# Altium footprint library Tomra_Cadstar_Footprints.PcbLib: 380 footprints (part 17 of 24)
Each footprint in its own frame and in the unit in brackets; x right, y up, seen from the top. Pads: shape width x height; smd on the part's side, far side on the other; paste and mask are expansions set on the pad; w line width, h text height; cw(c..) or ccw(c..) is an arc to the next point about the centre after c.
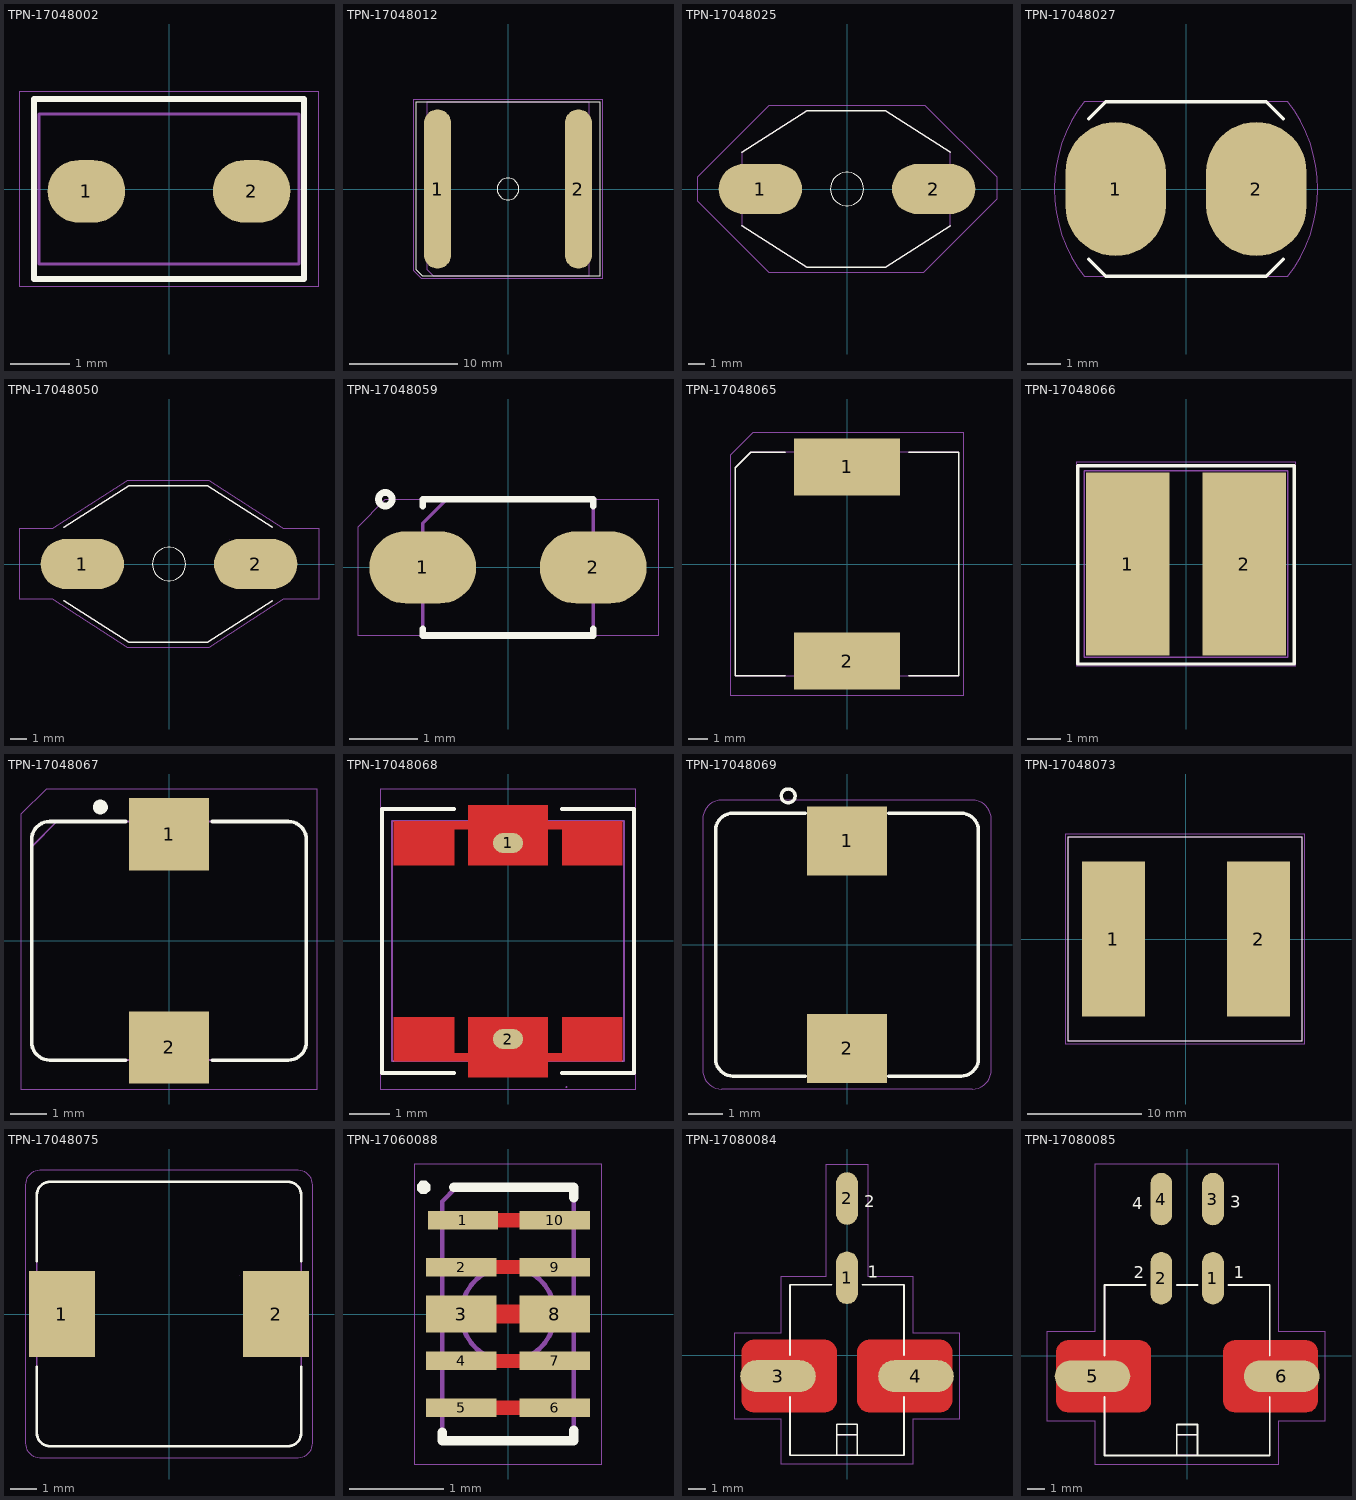
[diagram p16: the footprints below, top view; thin cyan lines are the x and y axes]

## TPN-17048002 [mm]
pads (2):
  oval 1.314x1.06 smd paste+0 mask+0: 1(-1.4,-0.04) 2(1.4,-0.04)
Top Silk:
  lines w0.1: -2.286,-1.524 2.286,-1.524 2.286,1.524 -2.286,1.524 -2.286,-1.524
  text ".Designator" at -3.599,-0.35 h0.7
Top Assembly:
  lines w0.05: -2.2,-1.27 2.2,-1.27 2.2,1.27 -2.2,1.27 -2.2,-1.27
Top Placement:
  lines w0.01: -2.54,-1.651 2.54,-1.651 2.54,1.651 -2.54,1.651 -2.54,-1.651

## TPN-17048012 [mm]
pads (2):
  oval 2.5x14.692 smd paste+0 mask+0: 1(-6.5,0) 2(6.5,0)
Top Silk:
  lines w0.1: -8.5,-7.4 -7.9,-8 8.5,-8 8.5,8 -8.5,8 -8.5,-7.4 ; 0,-1 cw(c0,0) 0,1 cw(c0,0) 0,-1
  text ".Designator" at -3.599,-0.35 h0.7
Top Assembly:
  lines w0.05: -7.5,-7.4 -6.9,-8 7.5,-8 7.5,8 -7.5,8 -7.5,-7.4
Top Placement:
  lines w0.01: -8.75,-7.5 -8,-8.25 8.75,-8.25 8.75,8.25 -8.75,8.25 -8.75,-7.5

## TPN-17048025 [mm]
height 11.3
pads (2):
  oval 5x3 smd paste+0 mask+0: 1(-5.2,0) 2(5.2,0)
Top Silk:
  lines w0.05: -1,0 ccw(c0,0) 1,0 ccw(c0,0) -1,0
  lines w0.1: -6.3,-2.2 -2.4,-4.7 2.3,-4.7 6.2,-2.2 ; -6.3,2.2 -2.4,4.7 2.3,4.7 6.2,2.2
Top Assembly:
  lines w0.05: -6.3,-2.2 -2.4,-4.7 2.3,-4.7 6.2,-2.2 6.2,2.2 2.3,4.7 -2.4,4.7 -6.3,2.2 -6.3,-2.2
Top Placement:
  lines w0.01: -9,-0.7 -4.7,-5 4.6,-5 9,-0.6 9,0.7 4.7,5 -4.7,5 -9,0.7 -9,-0.7
  lines w0.05: 3.653,1.462 3.655,1.463 3.655,1.464 3.654,1.464 3.654,1.463 3.653,1.462

## TPN-17048027 [mm]
height 4.85
pads (2):
  oval 3x4 smd paste+0 mask+0: 1(-2.1,0) 2(2.1,0)
Top Silk:
  lines w0.1: -2.9,-2.1 -2.4,-2.6 2.4,-2.6 2.9,-2.1 ; -2.9,2.1 -2.4,2.6 2.4,2.6 2.9,2.1
  text ".Designator" at -3.599,-0.35 h0.7
Top Assembly:
  lines w0.05: -2.9,-2.1 -2.4,-2.6 2.4,-2.6 2.9,-2.1 ; -2.9,2.1 -2.4,2.6 2.4,2.6 2.9,2.1
Top Placement:
  lines w0.01: -3.035,-2.6 3.035,-2.6 ccw(c-0.271,0) 3.035,2.6 -3.035,2.6 ccw(c0.271,0) -3.035,-2.6

## TPN-17048050 [mm]
height 11.3
pads (2):
  oval 5x3 smd paste+0 mask+0: 1(-5.2,0) 2(5.2,0)
Top Silk:
  lines w0.05: -1,0 ccw(c0,0) 1,0 ccw(c0,0) -1,0
  lines w0.1: -2.4,-4.7 -6.3,-2.2 -2.4,-4.7 ; -2.4,-4.7 2.3,-4.7 ; -2.4,-4.7 2.3,-4.7 ; -2.4,4.7 2.3,4.7 ; -2.4,4.7 -6.3,2.2 -2.4,4.7 ; -2.4,4.7 2.3,4.7 ; 2.3,-4.7 6.2,-2.2 2.3,-4.7 ; 2.3,4.7 6.2,2.2 2.3,4.7
  text ".Designator" at -2.6,2.471 h0.7
Top Assembly:
  lines w0.05: -6.3,-2.2 -2.4,-4.7 2.3,-4.7 6.2,-2.2 ; -6.3,2.2 -2.4,4.7 2.3,4.7 6.2,2.2
Top Placement:
  lines w0.01: -9,-2.1 -9,2.1 -7,2.1 -2.5,5 2.4,5 6.9,2.1 9,2.1 9,-2.1 6.9,-2.1 2.4,-5 -2.5,-5 -7,-2.1 -9,-2.1
  lines w0.05: 3.653,1.462 3.655,1.463 3.655,1.464 3.654,1.464 3.654,1.463 3.653,1.462

## TPN-17048059 [mm]
height 1.8
pads (2):
  oval 1.568x1.06 smd paste+0 mask+0: 1(-1.25,0) 2(1.25,0)
Top Silk:
  lines w0.1: -1.25,-0.9 -1.25,-1 1.25,-1 1.25,-0.9 ; -1.25,0.9 -1.25,1 1.25,1 1.25,0.9 ; -1.8,0.9 cw(c-1.8,1) -1.8,1.1 cw(c-1.8,1) -1.8,0.9
  text ".Designator" at -3.599,-0.35 h0.7
Top Assembly:
  lines w0.05: -1.25,-1 1.25,-1 1.25,1 -0.9,1 -1.25,0.65 -1.25,-1
Top Placement:
  lines w0.01: -2.2,-1 2.2,-1 2.2,1 -1.8,1 -2.2,0.6 -2.2,-1

## TPN-17048065 [mm]
height 10
pads (2):
  rrect0% 5.4x2.9 smd paste+0 mask+0: 1(0,4.95) 2(0,-4.95)
Top Silk:
  lines w0.1: -3.15,-5.7 -5.7,-5.7 -5.7,4.9 -4.9,5.7 -3.15,5.7 ; 3.15,-5.7 5.7,-5.7 5.7,5.7 3.15,5.7
  text ".Designator" at -3.599,-0.35 h0.7
Top Assembly:
  lines w0.05: -5.7,-5.7 5.7,-5.7 5.7,5.7 -4.9,5.7 -5.7,4.9 -5.7,-5.7
Top Placement:
  lines w0.01: -5.95,-6.7 5.95,-6.7 5.95,6.7 -4.8,6.7 -5.95,5.55 -5.95,-6.7
  lines w0.05: 1.462,-3.653 1.463,-3.655 1.464,-3.655 1.464,-3.654 1.463,-3.654 1.462,-3.653

## TPN-17048066 [mm]
height 2
pads (2):
  rrect0% 2.5x5.5 smd paste+0 mask+0: 1(-1.75,0) 2(1.75,0)
Top Silk:
  lines w0.1: -3.25,-3 3.25,-3 3.25,2.95 -3.25,2.95 -3.25,-3
  text ".Designator" at -3.599,-0.35 h0.7
Top Assembly:
  lines w0.05: -3.05,-2.8 3.05,-2.8 3.05,2.8 -3.05,2.8 -3.05,-2.8
Top Placement:
  lines w0.01: -3.3,-3.05 3.3,-3.05 3.3,3.05 -3.3,3.05 -3.3,-3.05

## TPN-17048067 [mm]
height 5.8
pads (2):
  rrect0% 2.2x2 smd paste+0 mask+0: 1(0,2.95) 2(0,-2.95)
Top Silk:
  region: -1.9,3.5 -1.94,3.5 -2.013,3.53 -2.07,3.587 -2.1,3.66 -2.1,3.74 -2.07,3.813 -2.013,3.87 -1.94,3.9 -1.9,3.9 -1.86,3.9 -1.787,3.87 -1.73,3.813 -1.7,3.74 -1.7,3.66 -1.73,3.587 -1.787,3.53 -1.86,3.5
  lines w0.1: -1.2,-3.3 -3.3,-3.3 cw(c-3.3,-2.8) -3.8,-2.8 -3.8,2.8 cw(c-3.3,2.8) -3.3,3.3 -1.2,3.3 ; 1.2,-3.3 3.3,-3.3 ccw(c3.3,-2.8) 3.8,-2.8 3.8,2.8 ccw(c3.3,2.8) 3.3,3.3 1.2,3.3
Top Assembly:
  lines w0.05: -3.8,-2.8 ccw(c-3.3,-2.8) -3.3,-3.3 3.3,-3.3 ccw(c3.3,-2.8) 3.8,-2.8 3.8,2.8 ccw(c3.3,2.8) 3.3,3.3 -3.1,3.3 -3.8,2.6 -3.8,-2.8
Top Placement:
  lines w0.01: -4.1,-4.1 4.1,-4.1 4.1,4.2 -3.4,4.2 -4.1,3.5 -4.1,-4.1

## TPN-17048068 [mm]
height 4.5
pads (2):
  oval 0.754x0.5 smd paste+0 mask+0: 1(0,2.45) 2(0,-2.45)
Top Elec:
  region: -2.85,1.9 -1.35,1.9 -1.35,2.8 -1,2.8 -1,1.9 1,1.9 1,2.8 1.35,2.8 1.35,1.9 2.85,1.9 2.85,3 1,3 1,3.4 -1,3.4 -1,3 -2.85,3
  region: 2.85,-1.9 1.35,-1.9 1.35,-2.8 1,-2.8 1,-1.9 -1,-1.9 -1,-2.8 -1.35,-2.8 -1.35,-1.9 -2.85,-1.9 -2.85,-3 -1,-3 -1,-3.4 1,-3.4 1,-3 2.85,-3
  region: -2.85,1.9 -1.35,1.9 -1.35,2.8 -1,2.8 -1,1.9 1,1.9 1,2.8 1.35,2.8 1.35,1.9 2.85,1.9 2.85,3 1,3 1,3.4 -1,3.4 -1,3 -2.85,3
Top Silk:
  lines w0.1: -1.35,-3.3 -3.15,-3.3 -3.15,3.3 -1.35,3.3 ; 1.35,-3.3 3.15,-3.3 3.15,3.3 1.35,3.3
Top Paste:
  region: -1,1.9 1,1.9 1,3.4 -1,3.4
  region: -1,-3.4 1,-3.4 1,-1.9 -1,-1.9
  region: -2.85,1.9 -1.5,1.9 -1.5,3 -2.85,3
  region: 1.5,-3 2.85,-3 2.85,-1.9 1.5,-1.9
  region: 1.5,1.9 2.85,1.9 2.85,3 1.5,3
  region: -2.85,-3 -1.5,-3 -1.5,-1.9 -2.85,-1.9
Top Solder Resist:
  region: 2.85,-1.9 -2.85,-1.9 -2.85,-3 -1,-3 -1,-3.4 1,-3.4 1,-3 2.85,-3
  region: -2.85,1.9 2.85,1.9 2.85,3 1,3 1,3.4 -1,3.4 -1,3 -2.85,3
Top Assembly:
  lines w0.05: -2.9,-3 2.9,-3 2.9,3 -2.9,3 -2.9,-3
  text ".Designator" at -1.799,-0.175 h0.35
Top Placement:
  lines w0.01: -3.2,-3.7 3.2,-3.7 3.2,3.8 -3.2,3.8 -3.2,-3.7
  lines w0.05: 1.462,-3.653 1.463,-3.655 1.464,-3.655 1.464,-3.654 1.463,-3.654 1.462,-3.653

## TPN-17048069 [mm]
height 5.5
pads (2):
  rrect0% 2.3x2 smd paste+0 mask+0: 1(0,3) 2(0,-3)
Top Silk:
  lines w0.1: -1.2,-3.8 -3.3,-3.8 cw(c-3.3,-3.3) -3.8,-3.3 -3.8,3.3 cw(c-3.3,3.3) -3.3,3.8 -1.2,3.8 ; 1.2,-3.8 3.3,-3.8 ccw(c3.3,-3.3) 3.8,-3.3 3.8,3.3 ccw(c3.3,3.3) 3.3,3.8 1.2,3.8 ; -1.7,4.1 cw(c-1.7,4.3) -1.7,4.5 cw(c-1.7,4.3) -1.7,4.1
  text ".Designator" at -3.599,-0.35 h0.7
Top Assembly:
  lines w0.05: -3.8,-3.3 ccw(c-3.3,-3.3) -3.3,-3.8 3.3,-3.8 ccw(c3.3,-3.3) 3.8,-3.3 3.8,3.3 ccw(c3.3,3.3) 3.3,3.8 -3.3,3.8 ccw(c-3.3,3.3) -3.8,3.3 -3.8,-3.3
Top Placement:
  lines w0.01: -4.175,-3.626 ccw(c-3.626,-3.626) -3.626,-4.175 3.626,-4.175 ccw(c3.626,-3.626) 4.175,-3.626 4.175,3.626 ccw(c3.626,3.626) 3.626,4.175 -3.626,4.175 ccw(c-3.626,3.626) -4.175,3.626 -4.175,-3.626

## TPN-17048073 [mm]
height 10
pads (2):
  rect 5.5x13.5 smd paste+0 mask+0: 1(-6.326,0) 2(6.374,0)
Top Silk:
  lines w0.1: -10.287,-8.89 10.16,-8.89 10.16,8.89 -10.287,8.89 -10.287,-8.89
Top Assembly:
  lines w0.05: -10.287,-8.89 10.16,-8.89 10.16,8.89 -10.287,8.89 -10.287,-8.89
Top Placement:
  lines w0.01: -10.537,-9.14 10.41,-9.14 10.41,9.14 -10.537,9.14 -10.537,-9.14
  text ".Designator" at -3.575,-0.35 h0.7

## TPN-17048075 [mm]
height 4.5
pads (2):
  rrect0% 2.5x3.25 smd paste+0 mask+0: 1(-4.05,0) 2(4.05,0)
Top Silk:
  lines w0.1: -5,-2 -5,-4.5 ccw(c-4.5,-4.5) -4.5,-5 4.5,-5 ccw(c4.5,-4.5) 5,-4.5 5,-2 ; -5,2 -5,4.5 cw(c-4.5,4.5) -4.5,5 4.5,5 cw(c4.5,4.5) 5,4.5 5,2
  text ".Designator" at 0.35,-3.599 h0.7
Top Assembly:
  lines w0.05: -5,-4.5 -5,4.5 cw(c-4.5,4.5) -4.5,5 4.5,5 cw(c4.5,4.5) 5,4.5 5,-4.5 cw(c4.5,-4.5) 4.5,-5 -4.5,-5 cw(c-4.5,-4.5) -5,-4.5
Top Placement:
  lines w0.01: -5.432,-4.889 -5.432,4.889 cw(c-4.889,4.889) -4.889,5.432 4.889,5.432 cw(c4.889,4.889) 5.432,4.889 5.432,-4.889 cw(c4.889,-4.889) 4.889,-5.432 -4.889,-5.432 cw(c-4.889,-4.889) -5.432,-4.889
  lines w0.05: 2.653,1.462 2.655,1.463 2.655,1.464 2.654,1.464 2.654,1.463 2.653,1.462

## TPN-17060088 [mm]
height 0.65
pads (10):
  rrect0% 0.75x0.2 smd paste+0 mask+0: 1(-0.48,1) 2(-0.5,0.5) 4(-0.5,-0.5) 5(-0.5,-1) 6(0.5,-1) 7(0.5,-0.5) 9(0.5,0.5) 10(0.5,1)
  rrect0% 0.75x0.4 smd paste+0 mask+0: 3(-0.5,0) 8(0.5,0)
Top Elec:
  lines w0.15: -0.61,-1 0.61,-1 ; -0.61,-0.5 0.61,-0.5 ; -0.61,0.5 0.61,0.5 ; -0.61,1 0.61,1
  lines w0.2: -0.61,0 0.61,0
Top Silk:
  region: -0.9,1.28 -0.929,1.28 -0.97,1.321 -0.97,1.379 -0.929,1.42 -0.9,1.42 -0.871,1.42 -0.83,1.379 -0.83,1.321 -0.871,1.28
  lines w0.1: -0.7,-1.26 -0.7,-1.35 0.7,-1.35 0.7,-1.24 ; -0.58,1.35 0.7,1.35 0.7,1.24
  text ".Designator" at -0.58,1.35 h0.35
Drill:
  lines w0.05: -0.5,0 cw(c0,0) 0.5,0 cw(c0,0) -0.5,0
Top Assembly:
  lines w0.05: -0.7,-1.35 0.7,-1.35 0.7,1.35 -0.55,1.35 -0.7,1.2 -0.7,-1.35
Top Placement:
  lines w0.01: -1,-1.6 1,-1.6 1,1.6 -1,1.6 -1,-1.6

## TPN-17080084 [mm]
height 8
pads (4):
  oval 1.27x3.048 smd paste+0 mask+0: 1(0,4.5) 2(0,9.1)
  oval 4.39x1.85 smd paste+0 mask+0: 3(-4,-1.2) 4(4,-1.2)
Top Elec:
  region: -6.1,0.2 -6.1,0.269 -6.073,0.404 -6.02,0.532 -5.944,0.646 -5.846,0.744 -5.732,0.82 -5.604,0.873 -5.469,0.9 -5.4,0.9 -1.3,0.9 -1.231,0.9 -1.096,0.873 -0.968,0.82 -0.854,0.744 -0.756,0.646 -0.68,0.532 -0.627,0.404 -0.6,0.269 -0.6,0.2 -0.6,-2.6 -0.6,-2.669 -0.627,-2.804 -0.68,-2.932 -0.756,-3.046 -0.854,-3.144 -0.968,-3.22 -1.096,-3.273 -1.231,-3.3 -1.3,-3.3 -5.4,-3.3 -5.469,-3.3 -5.604,-3.273 -5.732,-3.22 -5.846,-3.144 -5.944,-3.046 -6.02,-2.932 -6.073,-2.804 -6.1,-2.669 -6.1,-2.6
  region: 0.6,0.2 0.6,0.269 0.627,0.404 0.68,0.532 0.756,0.646 0.854,0.744 0.968,0.82 1.096,0.873 1.231,0.9 1.3,0.9 5.4,0.9 5.469,0.9 5.604,0.873 5.732,0.82 5.846,0.744 5.944,0.646 6.02,0.532 6.073,0.404 6.1,0.269 6.1,0.2 6.1,-2.6 6.1,-2.669 6.073,-2.804 6.02,-2.932 5.944,-3.046 5.846,-3.144 5.732,-3.22 5.604,-3.273 5.469,-3.3 5.4,-3.3 1.3,-3.3 1.231,-3.3 1.096,-3.273 0.968,-3.22 0.854,-3.144 0.756,-3.046 0.68,-2.932 0.627,-2.804 0.6,-2.669 0.6,-2.6
Top Silk:
  lines w0.1: -3.3,-2.4 -3.3,-5.8 3.3,-5.8 3.3,-2.4 ; -3.3,0 -3.3,4.1 -0.9,4.1 ; -0.6,-4.6 0.6,-4.6 ; 0.9,4.1 3.3,4.1 3.3,0 ; -0.6,-5.8 0.6,-5.8 0.6,-4 -0.6,-4 -0.6,-5.8
  text "1" at 1.2,4.5 h0.7
  text "2" at 1,8.6 h0.7
  text ".Designator" at 0,0 h0.7
Top Assembly:
  lines w0.05: -3.3,-2.4 -3.3,-5.8 3.3,-5.8 3.3,-2.4 ; -3.3,0 -3.3,4.1 -0.9,4.1 ; -0.6,-4.6 0.6,-4.6 ; 0.9,4.1 3.3,4.1 3.3,0 ; -0.6,-5.8 0.6,-5.8 0.6,-4 -0.6,-4 -0.6,-5.8
  text "2" at 1,8.6 h0.7
  text "1" at 1.2,4.5 h0.7
Top Placement:
  lines w0.01: -6.5,-3.7 -3.8,-3.7 -3.8,-6.3 3.8,-6.3 3.8,-3.7 6.5,-3.7 6.5,1.3 3.8,1.3 3.8,4.6 1.2,4.6 1.2,11.1 -1.2,11.1 -1.2,4.6 -3.8,4.6 -3.8,1.3 -6.5,1.3 -6.5,-3.7
  text "2" at 1,8.6 h0.7
  text "1" at 1.2,4.5 h0.7

## TPN-17080085 [mm]
height 8
pads (6):
  oval 1.27x3.048 smd paste+0 mask+0: 1(1.5,4.5) 2(-1.5,4.5) 3(1.5,9.1) 4(-1.5,9.1)
  oval 4.39x1.85 smd paste+0 mask+0: 5(-5.5,-1.2) 6(5.5,-1.2)
Top Elec:
  region: -7.6,0.2 -7.6,0.269 -7.573,0.404 -7.52,0.532 -7.444,0.646 -7.346,0.744 -7.232,0.82 -7.104,0.873 -6.969,0.9 -6.9,0.9 -2.8,0.9 -2.731,0.9 -2.596,0.873 -2.468,0.82 -2.354,0.744 -2.256,0.646 -2.18,0.532 -2.127,0.404 -2.1,0.269 -2.1,0.2 -2.1,-2.6 -2.1,-2.669 -2.127,-2.804 -2.18,-2.932 -2.256,-3.046 -2.354,-3.144 -2.468,-3.22 -2.596,-3.273 -2.731,-3.3 -2.8,-3.3 -6.9,-3.3 -6.969,-3.3 -7.104,-3.273 -7.232,-3.22 -7.346,-3.144 -7.444,-3.046 -7.52,-2.932 -7.573,-2.804 -7.6,-2.669 -7.6,-2.6
  region: 2.1,0.2 2.1,0.269 2.127,0.404 2.18,0.532 2.256,0.646 2.354,0.744 2.468,0.82 2.596,0.873 2.731,0.9 2.8,0.9 6.9,0.9 6.969,0.9 7.104,0.873 7.232,0.82 7.346,0.744 7.444,0.646 7.52,0.532 7.573,0.404 7.6,0.269 7.6,0.2 7.6,-2.6 7.6,-2.669 7.573,-2.804 7.52,-2.932 7.444,-3.046 7.346,-3.144 7.232,-3.22 7.104,-3.273 6.969,-3.3 6.9,-3.3 2.8,-3.3 2.731,-3.3 2.596,-3.273 2.468,-3.22 2.354,-3.144 2.256,-3.046 2.18,-2.932 2.127,-2.804 2.1,-2.669 2.1,-2.6
Top Silk:
  lines w0.1: -4.8,-2.4 -4.8,-5.8 4.8,-5.8 4.8,-2.4 ; -4.8,0 -4.8,4.1 -2.4,4.1 ; -0.6,-4.6 0.6,-4.6 ; -0.6,4.1 0.6,4.1 ; 2.4,4.1 4.8,4.1 4.8,0 ; -0.6,-5.8 0.6,-5.8 0.6,-4 -0.6,-4 -0.6,-5.8
  text "4" at -3.2,8.5 h0.7
  text "1" at 2.7,4.5 h0.7
  text "2" at -3.1,4.5 h0.7
  text "3" at 2.5,8.6 h0.7
  text ".Designator" at 0,0 h0.7
Top Assembly:
  lines w0.05: -4.8,-2.4 -4.8,-5.8 4.8,-5.8 4.8,-2.4 ; -4.8,0 -4.8,4.1 -2.4,4.1 ; -0.6,-4.6 0.6,-4.6 ; -0.6,4.1 0.6,4.1 ; 2.4,4.1 4.8,4.1 4.8,0 ; -0.6,-5.8 0.6,-5.8 0.6,-4 -0.6,-4 -0.6,-5.8
  text "1" at 2.7,4.5 h0.7
  text "4" at -3.2,8.5 h0.7
  text "2" at -3.1,4.5 h0.7
  text "3" at 2.5,8.6 h0.7
Top Placement:
  lines w0.01: -0.6,-4.6 0.6,-4.6 ; -8.165,-3.8 -8.165,1.4 -5.365,1.4 -5.365,11.14 5.33,11.14 5.33,1.4 8.035,1.4 8.035,-3.8 5.335,-3.8 5.33,-6.3 -5.365,-6.3 -5.365,-3.8 -8.165,-3.8 ; -0.6,-5.8 0.6,-5.8 0.6,-4 -0.6,-4 -0.6,-5.8
  text "4" at -3.2,8.5 h0.7
  text "4" at -3.2,8.5 h0.7
  text "1" at 2.7,4.5 h0.7
  text "1" at 2.7,4.5 h0.7
  text "2" at -3.1,4.5 h0.7
  text "2" at -3.1,4.5 h0.7
  text "3" at 2.5,8.6 h0.7
  text "3" at 2.5,8.6 h0.7